# Altium footprint library 保险丝.PcbLib: 9 footprints
Each footprint in its own frame and in the unit in brackets; x right, y up, seen from the top. Pads: shape width x height; smd on the part's side, far side on the other; paste and mask are expansions set on the pad; w line width, h text height; cw(c..) or ccw(c..) is an arc to the next point about the centre after c.
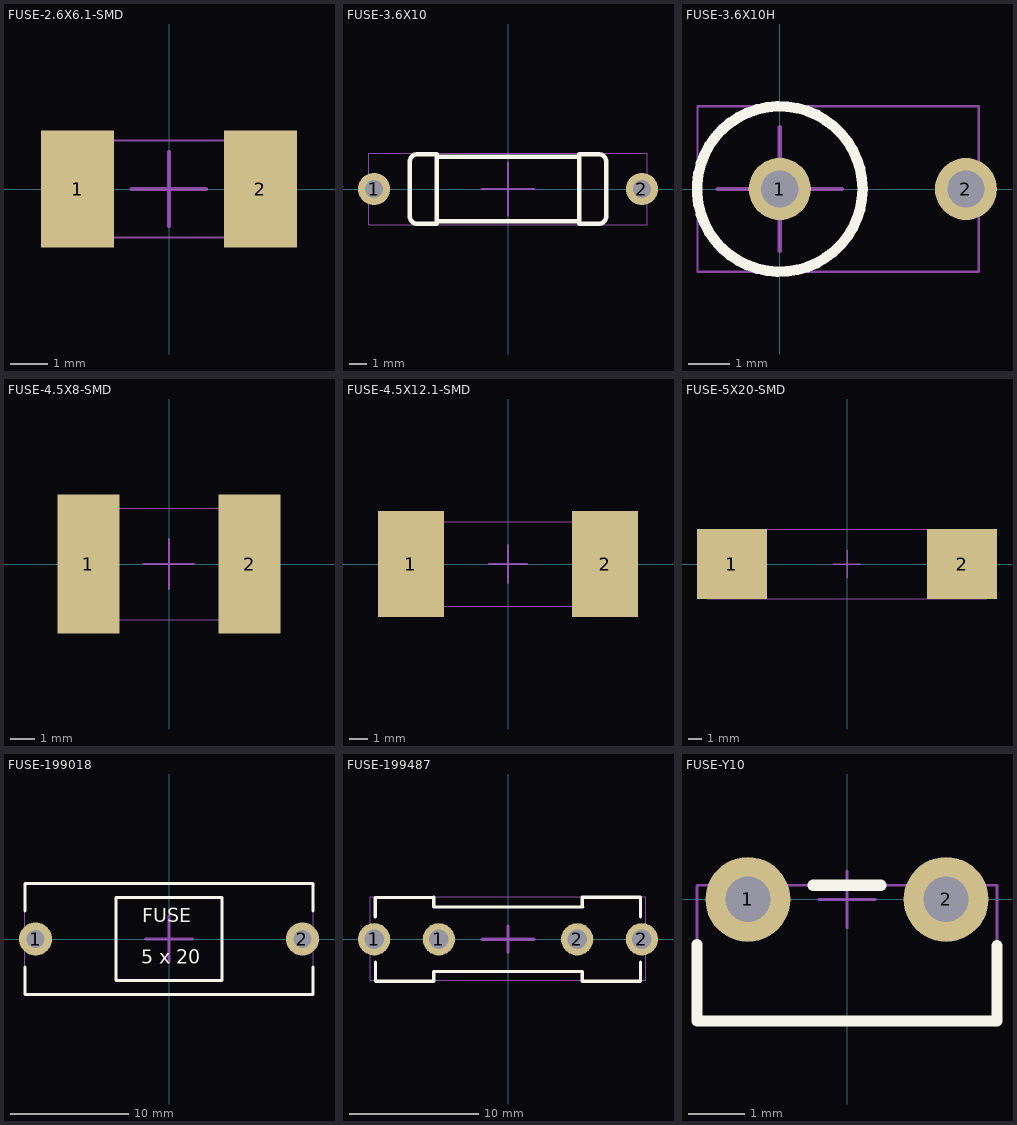
[diagram p0: the footprints below, top view; thin cyan lines are the x and y axes]

## FUSE-2.6X6.1-SMD [mm] "SIBA 0.25 ~6.3A SMD FUSE"
height 2.6
pads (2):
  rect 1.96x3.15 smd: 1(-2.45,0) 2(2.45,0)
Mechanical 13:
  lines w0.05: -3.05,-1.3 -3.05,1.3 3.05,1.3 3.05,-1.3 -3.05,-1.3
Mechanical 15:
  lines w0.1: -1.016,0 1,0 ; 0,-1 0,1
3D body: height 2.6, standoff 0, extent -3.05,-1.3 3.05,1.3

## FUSE-3.6X10 [mm] "引线式电流保险丝"
height 3.9
pads (2):
  round 1.8 hole 1: 1(-7.5,0) 2(7.5,0)
Top Overlay:
  lines w0.254: -4,-1.8 4,-1.8 ; -4,-1.8 -4,1.8 ; -4,-1.8 -4,-1.95 -5.08,-1.95 cw(c-5.08,-1.53) -5.5,-1.53 -5.5,1.53 cw(c-5.08,1.53) -5.08,1.95 -4,1.95 -4,1.8 ; -4,1.8 4,1.8 ; 4,-1.8 4,-1.95 5.08,-1.95 ccw(c5.08,-1.53) 5.5,-1.53 5.5,1.53 ccw(c5.08,1.53) 5.08,1.95 4,1.95 4,1.8 ; 4,-1.8 4,1.8
Mechanical 13:
  lines w0.05: -7.802,-2 7.798,-2 7.798,2 -7.802,2 -7.802,-2
Mechanical 15:
  lines w0.1: -1.5,0 0,0 ; 0,-1.5 0,0 ; 0,1.5 0,0 ; 1.5,0 0,0
3D body: height 4.1, standoff -5.4, extent -7.802,-2 7.798,2

## FUSE-3.6X10H [mm] "引线式电流保险丝"
height 3.9
pads (2):
  round 1.5 hole 0.9: 1(0,0) 2(4.5,0)
Top Overlay:
  circle w0.254: c0,0 r2
Mechanical 13:
  lines w0.05: -1.991,-2 -1.991,2 4.809,2 4.809,-2 -1.991,-2
Mechanical 15:
  lines w0.1: -1.5,0 0,0 ; 0,-1.5 0,0 ; 0,1.5 0,0 ; 1.5,0 0,0
3D body: height 13.7, standoff -3.4, extent -1.991,-2 4.809,2

## FUSE-4.5X8-SMD [mm] "SIBA 0.1 ~5A SMD FUSE"
height 4.5
pads (2):
  rect 2.5x5.6 smd: 1(-3.25,0) 2(3.25,0)
Mechanical 13:
  lines w0.05: -4,-2.25 -4,2.25 4,2.25 4,-2.25 -4,-2.25
Mechanical 15:
  lines w0.1: -1.016,0 1,0 ; 0,-1 0,1
3D body: height 4.55, standoff 0.05, extent -4,-2.25 4,2.25

## FUSE-4.5X12.1-SMD [mm] "Littelfuse 0.5 ~6.3A SMD FUSE"
height 4.5
pads (2):
  rect 3.5x5.6 smd: 1(-5.15,0) 2(5.15,0)
Mechanical 13:
  lines w0.05: -6.05,-2.25 6.05,-2.25 6.05,2.25 -6.05,2.25 -6.05,-2.25
Mechanical 15:
  lines w0.1: -1.016,0 1,0 ; 0,-1 0,1
3D body: height 4.55, standoff 0.05, extent -6.05,-2.25 6.05,2.25

## FUSE-5X20-SMD [mm] "5X20熔断器贴片封装"
height 5
pads (2):
  rect 5x5 smd: 1(-8.25,0) 2(8.25,0)
Mechanical 13:
  lines w0.05: -10,-2.5 -10,2.5 10,2.5 10,-2.5 -10,-2.5
Mechanical 15:
  lines w0.1: -1.016,0 1,0 ; 0,-1 0,1
3D body: height 5.05, standoff 0.05, extent -10,-2.5 10,2.5

## FUSE-199018 [mm] "5X20保险丝座"
height 11.5
pads (2):
  round 2.8 hole 1.5: 1(-11.3,0) 2(11.3,0)
Top Overlay:
  lines w0.254: -12.2,-2.35 -12.2,-4.7 12.2,-4.7 12.2,-2.35 ; -12.2,2.35 -12.2,4.7 12.2,4.7 12.2,2.35 ; -4.5,-3.5 4.5,-3.5 4.5,3.5 -4.5,3.5 -4.5,-3.5
  text "5 x 20" at -2.362,-2.464 h2
  text "FUSE" at -2.286,1.041 h2
Mechanical 13:
  lines w0.05: -12.2,-4.7 12.2,-4.7 12.2,4.7 -12.2,4.7 -12.2,-4.7
Mechanical 15:
  lines w0.254: -2,0 2,0 ; 0,-2 0,2
3D body: height 13.4, standoff -3.5, extent -12.2,-4.7 12.2,4.7

## FUSE-199487 [mm] "5X20保险丝"
height 9
pads (4):
  round 2.5 hole 1.5: 1(-10.354,0) 1(-5.354,0) 2(5.354,0) 2(10.354,0)
Top Overlay:
  lines w0.254: -10.279,1.725 -10.279,3.225 -5.779,3.225 ; -10.254,-1.75 -10.254,-3.25 -5.754,-3.25 -5.754,-2.5 5.754,-2.5 5.754,-3.25 10.254,-3.25 10.254,-1.75 ; -5.754,3.25 -5.754,2.5 5.791,2.5 ; 5.754,2.5 5.754,3.25 10.254,3.25 10.254,1.75
Mechanical 13:
  lines w0.05: -10.658,-3.175 -10.658,3.293 10.658,3.293 10.658,-3.175 -10.658,-3.175
Mechanical 15:
  lines w0.254: -2,0 2,0 ; 0,-1 0,1
3D body: height 9.5, standoff -3, extent -10.658,-3.175 11.158,3.293

## FUSE-Y10 [mm] "温度熔断器"
height 2.4
pads (2):
  round 1.5 hole 0.8 unplated: 1(-1.75,0) 2(1.75,0)
Top Overlay:
  lines w0.2: -2.65,-0.796 -2.65,-2.15 2.65,-2.15 2.65,-0.821 ; -0.6,0.25 0.6,0.25
Mechanical 13:
  lines w0.05: -2.65,-2.15 2.65,-2.15 2.65,0.25 -2.638,0.25 -2.65,0.238 -2.65,-2.15
Mechanical 15:
  lines w0.05: -0.5,0 0.5,0 ; 0,-0.5 0,0.5
3D body: height 5.8, standoff -3.5, extent -2.65,-2.15 2.65,0.255